# Altium footprint library ST封装.PcbLib: 1336 footprints (part 63 of 109)
Each footprint in its own frame and in the unit in brackets; x right, y up, seen from the top. Pads: shape width x height; smd on the part's side, far side on the other; paste and mask are expansions set on the pad; w line width, h text height; cw(c..) or ccw(c..) is an arc to the next point about the centre after c.
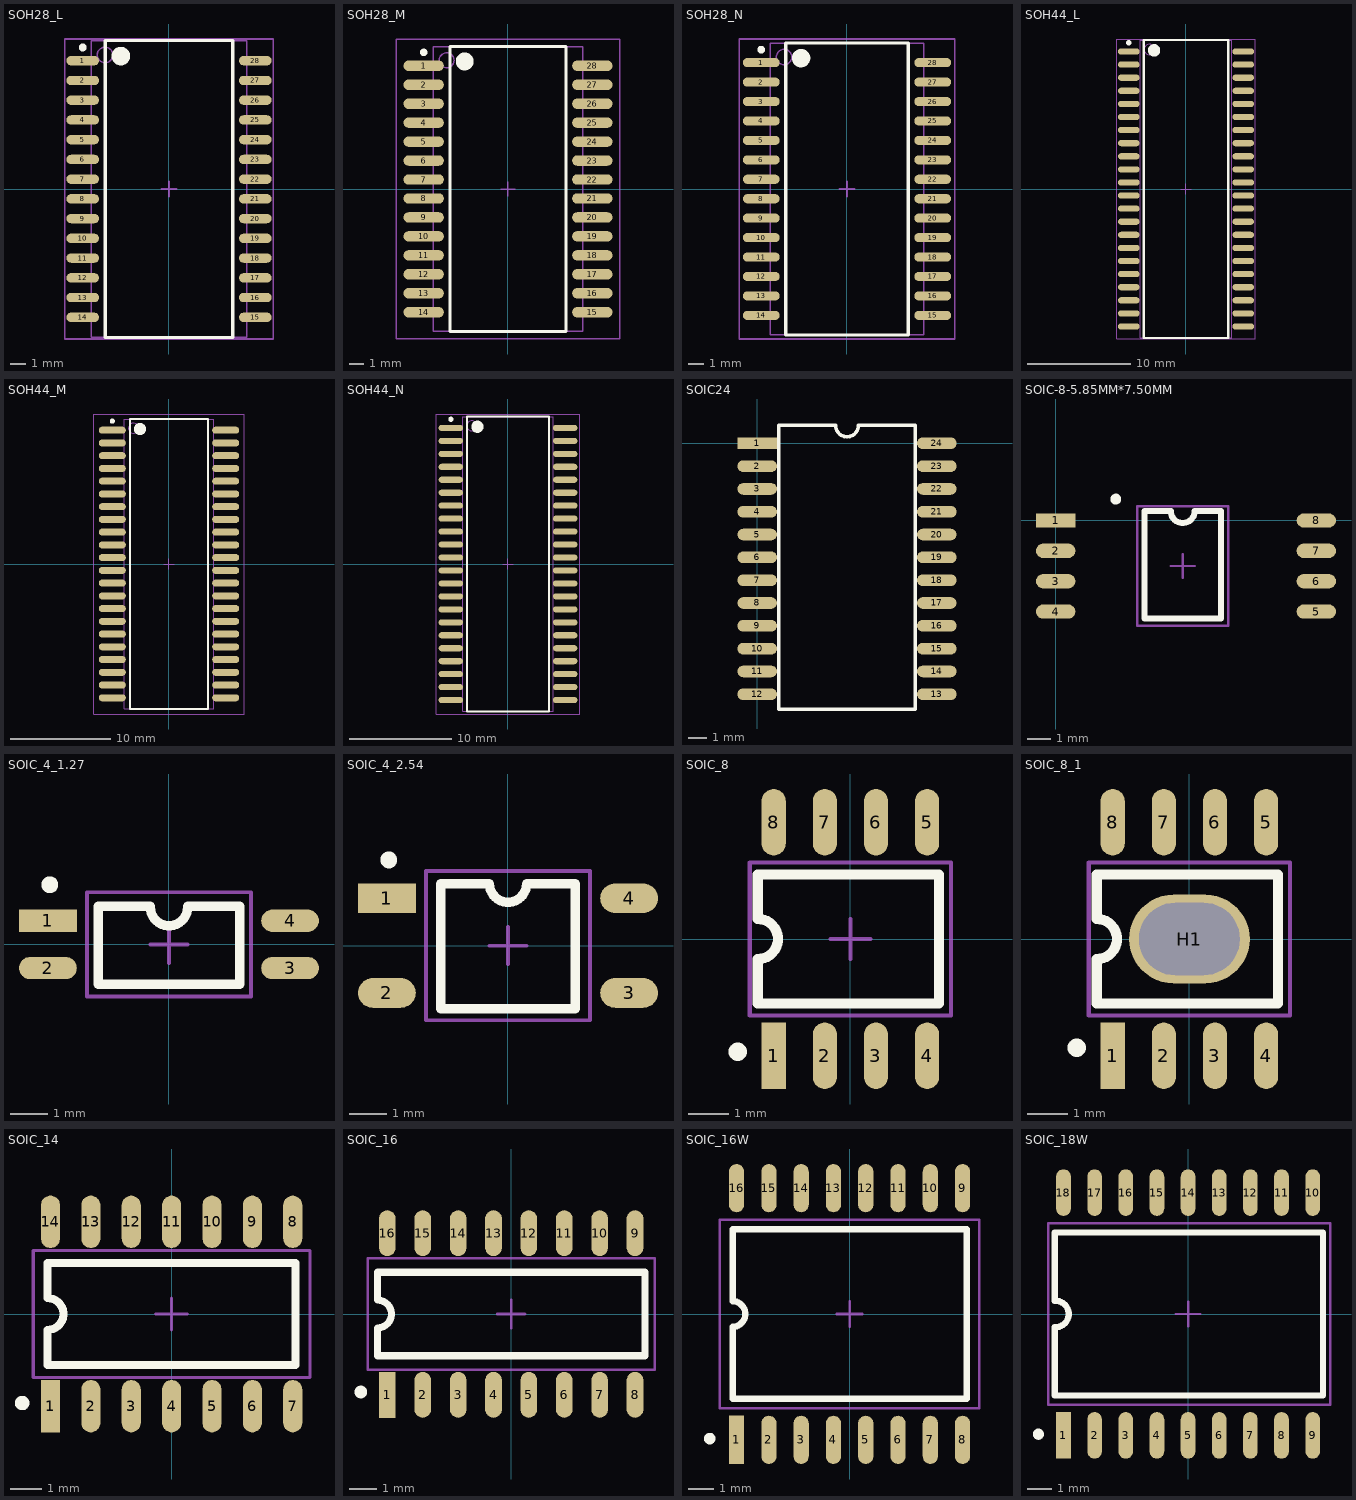
[diagram p62: the footprints below, top view; thin cyan lines are the x and y axes]

## SOH28_L [mm] "28-Pin Plastic Battery Snaphat Small Outline Package 1.27 mm Pitch, IPC High Density"
height 3.05
pads (28):
  oval 2.1x0.6 smd: 1(-5.55,8.255) 2(-5.55,6.985) 3(-5.55,5.715) 4(-5.55,4.445) 5(-5.55,3.175) 6(-5.55,1.905) 7(-5.55,0.635) 8(-5.55,-0.635) 9(-5.55,-1.905) 10(-5.55,-3.175) 11(-5.55,-4.445) 12(-5.55,-5.715) 13(-5.55,-6.985) 14(-5.55,-8.255) 15(5.55,-8.255) 16(5.55,-6.985) 17(5.55,-5.715) 18(5.55,-4.445) 19(5.55,-3.175) 20(5.55,-1.905) 21(5.55,-0.635) 22(5.55,0.635) 23(5.55,1.905) 24(5.55,3.175) 25(5.55,4.445) 26(5.55,5.715) 27(5.55,6.985) 28(5.55,8.255)
Top Overlay:
  circle w0.6: c-3.1,8.55 r0.3
  circle w0.25: c-5.55,9.105 r0.125
  lines w0.2: -4.1,-9.55 4.1,-9.55 4.1,9.55 -4.1,9.55 -4.1,-9.55
Mechanical 13:
  circle w0.1: c-4.115,8.625 r0.5
  lines w0.1: -5.015,-9.525 5.015,-9.525 5.015,9.525 -5.015,9.525 -5.015,-9.525
Mechanical 15:
  lines w0.1: -0.5,0 0.5,0 ; 0,-0.5 0,0.5 ; -6.7,-9.65 6.7,-9.65 6.7,9.65 -6.7,9.65 -6.7,-9.65
3D body: height 3.05, standoff 0, extent -5.015,-9.525 5.015,9.525

## SOH28_M [mm] "28-Pin Plastic Battery Snaphat Small Outline Package 1.27 mm Pitch, IPC Low Density"
height 3.05
pads (28):
  oval 2.7x0.7 smd: 1(-5.65,8.255) 2(-5.65,6.985) 3(-5.65,5.715) 4(-5.65,4.445) 5(-5.65,3.175) 6(-5.65,1.905) 7(-5.65,0.635) 8(-5.65,-0.635) 9(-5.65,-1.905) 10(-5.65,-3.175) 11(-5.65,-4.445) 12(-5.65,-5.715) 13(-5.65,-6.985) 14(-5.65,-8.255) 15(5.65,-8.255) 16(5.65,-6.985) 17(5.65,-5.715) 18(5.65,-4.445) 19(5.65,-3.175) 20(5.65,-1.905) 21(5.65,-0.635) 22(5.65,0.635) 23(5.65,1.905) 24(5.65,3.175) 25(5.65,4.445) 26(5.65,5.715) 27(5.65,6.985) 28(5.65,8.255)
Top Overlay:
  circle w0.6: c-2.9,8.55 r0.3
  circle w0.25: c-5.65,9.155 r0.125
  lines w0.2: -3.9,-9.55 3.9,-9.55 3.9,9.55 -3.9,9.55 -3.9,-9.55
Mechanical 13:
  circle w0.1: c-4.115,8.625 r0.5
  lines w0.1: -5.015,-9.525 5.015,-9.525 5.015,9.525 -5.015,9.525 -5.015,-9.525
Mechanical 15:
  lines w0.1: -0.5,0 0.5,0 ; 0,-0.5 0,0.5 ; -7.5,-10.05 7.5,-10.05 7.5,10.05 -7.5,10.05 -7.5,-10.05
3D body: height 3.05, standoff 0, extent -5.015,-9.525 5.015,9.525

## SOH28_N [mm] "28-Pin Plastic Battery Snaphat Small Outline Package 1.27 mm Pitch, IPC Medium Density"
height 3.05
pads (28):
  oval 2.4x0.6 smd: 1(-5.6,8.255) 2(-5.6,6.985) 3(-5.6,5.715) 4(-5.6,4.445) 5(-5.6,3.175) 6(-5.6,1.905) 7(-5.6,0.635) 8(-5.6,-0.635) 9(-5.6,-1.905) 10(-5.6,-3.175) 11(-5.6,-4.445) 12(-5.6,-5.715) 13(-5.6,-6.985) 14(-5.6,-8.255) 15(5.6,-8.255) 16(5.6,-6.985) 17(5.6,-5.715) 18(5.6,-4.445) 19(5.6,-3.175) 20(5.6,-1.905) 21(5.6,-0.635) 22(5.6,0.635) 23(5.6,1.905) 24(5.6,3.175) 25(5.6,4.445) 26(5.6,5.715) 27(5.6,6.985) 28(5.6,8.255)
Top Overlay:
  circle w0.25: c-5.6,9.105 r0.125
  circle w0.6: c-3,8.55 r0.3
  lines w0.2: -4,-9.55 -4,9.55 4,9.55 4,-9.55 -4,-9.55
Mechanical 13:
  circle w0.1: c-4.115,8.625 r0.5
  lines w0.1: -5.015,-9.525 -5.015,9.525 5.015,9.525 5.015,-9.525 -5.015,-9.525
Mechanical 15:
  lines w0.1: -0.5,0 0.5,0 ; 0,-0.5 0,0.5 ; -7.05,-9.8 -7.05,9.8 7.05,9.8 7.05,-9.8 -7.05,-9.8
3D body: height 3.05, standoff 0, extent -5.015,-9.525 5.015,9.525

## SOH44_L [mm] "44-Pin Plastic Battery Snaphat Small Outline Package 1.27 mm Pitch, IPC High Density"
height 3.05
pads (44):
  oval 2.1x0.6 smd: 1(-5.55,13.335) 2(-5.55,12.065) 3(-5.55,10.795) 4(-5.55,9.525) 5(-5.55,8.255) 6(-5.55,6.985) 7(-5.55,5.715) 8(-5.55,4.445) 9(-5.55,3.175) 10(-5.55,1.905) 11(-5.55,0.635) 12(-5.55,-0.635) 13(-5.55,-1.905) 14(-5.55,-3.175) 15(-5.55,-4.445) 16(-5.55,-5.715) 17(-5.55,-6.985) 18(-5.55,-8.255) 19(-5.55,-9.525) 20(-5.55,-10.795) 21(-5.55,-12.065) 22(-5.55,-13.335) 23(5.55,-13.335) 24(5.55,-12.065) 25(5.55,-10.795) 26(5.55,-9.525) 27(5.55,-8.255) 28(5.55,-6.985) 29(5.55,-5.715) 30(5.55,-4.445) 31(5.55,-3.175) 32(5.55,-1.905) 33(5.55,-0.635) 34(5.55,0.635) 35(5.55,1.905) 36(5.55,3.175) 37(5.55,4.445) 38(5.55,5.715) 39(5.55,6.985) 40(5.55,8.255) 41(5.55,9.525) 42(5.55,10.795) 43(5.55,12.065) 44(5.55,13.335)
Top Overlay:
  circle w0.6: c-3.1,13.45 r0.3
  circle w0.25: c-5.55,14.185 r0.125
  lines w0.2: -4.1,-14.45 4.1,-14.45 4.1,14.45 -4.1,14.45 -4.1,-14.45
Mechanical 13:
  circle w0.1: c-3.545,13.535 r0.5
  lines w0.1: -4.445,-14.435 4.445,-14.435 4.445,14.435 -4.445,14.435 -4.445,-14.435
Mechanical 15:
  lines w0.1: -0.5,0 0.5,0 ; 0,-0.5 0,0.5 ; -6.7,-14.55 6.7,-14.55 6.7,14.55 -6.7,14.55 -6.7,-14.55
3D body: height 3.05, standoff 0, extent -4.445,-14.435 4.445,14.435

## SOH44_M [mm] "44-Pin Plastic Battery Snaphat Small Outline Package 1.27 mm Pitch, IPC Low Density"
height 3.05
pads (44):
  oval 2.7x0.7 smd: 1(-5.65,13.335) 2(-5.65,12.065) 3(-5.65,10.795) 4(-5.65,9.525) 5(-5.65,8.255) 6(-5.65,6.985) 7(-5.65,5.715) 8(-5.65,4.445) 9(-5.65,3.175) 10(-5.65,1.905) 11(-5.65,0.635) 12(-5.65,-0.635) 13(-5.65,-1.905) 14(-5.65,-3.175) 15(-5.65,-4.445) 16(-5.65,-5.715) 17(-5.65,-6.985) 18(-5.65,-8.255) 19(-5.65,-9.525) 20(-5.65,-10.795) 21(-5.65,-12.065) 22(-5.65,-13.335) 23(5.65,-13.335) 24(5.65,-12.065) 25(5.65,-10.795) 26(5.65,-9.525) 27(5.65,-8.255) 28(5.65,-6.985) 29(5.65,-5.715) 30(5.65,-4.445) 31(5.65,-3.175) 32(5.65,-1.905) 33(5.65,-0.635) 34(5.65,0.635) 35(5.65,1.905) 36(5.65,3.175) 37(5.65,4.445) 38(5.65,5.715) 39(5.65,6.985) 40(5.65,8.255) 41(5.65,9.525) 42(5.65,10.795) 43(5.65,12.065) 44(5.65,13.335)
Top Overlay:
  circle w0.6: c-2.9,13.45 r0.3
  circle w0.25: c-5.65,14.235 r0.125
  lines w0.2: -3.9,-14.45 3.9,-14.45 3.9,14.45 -3.9,14.45 -3.9,-14.45
Mechanical 13:
  circle w0.1: c-3.545,13.535 r0.5
  lines w0.1: -4.445,-14.435 4.445,-14.435 4.445,14.435 -4.445,14.435 -4.445,-14.435
Mechanical 15:
  lines w0.1: -0.5,0 0.5,0 ; 0,-0.5 0,0.5 ; -7.5,-14.95 7.5,-14.95 7.5,14.95 -7.5,14.95 -7.5,-14.95
3D body: height 3.05, standoff 0, extent -4.445,-14.435 4.445,14.435

## SOH44_N [mm] "44-Pin Plastic Battery Snaphat Small Outline Package 1.27 mm Pitch, IPC Medium Density"
height 3.05
pads (44):
  oval 2.4x0.6 smd: 1(-5.6,13.335) 2(-5.6,12.065) 3(-5.6,10.795) 4(-5.6,9.525) 5(-5.6,8.255) 6(-5.6,6.985) 7(-5.6,5.715) 8(-5.6,4.445) 9(-5.6,3.175) 10(-5.6,1.905) 11(-5.6,0.635) 12(-5.6,-0.635) 13(-5.6,-1.905) 14(-5.6,-3.175) 15(-5.6,-4.445) 16(-5.6,-5.715) 17(-5.6,-6.985) 18(-5.6,-8.255) 19(-5.6,-9.525) 20(-5.6,-10.795) 21(-5.6,-12.065) 22(-5.6,-13.335) 23(5.6,-13.335) 24(5.6,-12.065) 25(5.6,-10.795) 26(5.6,-9.525) 27(5.6,-8.255) 28(5.6,-6.985) 29(5.6,-5.715) 30(5.6,-4.445) 31(5.6,-3.175) 32(5.6,-1.905) 33(5.6,-0.635) 34(5.6,0.635) 35(5.6,1.905) 36(5.6,3.175) 37(5.6,4.445) 38(5.6,5.715) 39(5.6,6.985) 40(5.6,8.255) 41(5.6,9.525) 42(5.6,10.795) 43(5.6,12.065) 44(5.6,13.335)
Top Overlay:
  circle w0.6: c-3,13.45 r0.3
  circle w0.25: c-5.6,14.185 r0.125
  lines w0.2: -4,-14.45 4,-14.45 4,14.45 -4,14.45 -4,-14.45
Mechanical 13:
  circle w0.1: c-3.545,13.535 r0.5
  lines w0.1: -4.445,-14.435 4.445,-14.435 4.445,14.435 -4.445,14.435 -4.445,-14.435
Mechanical 15:
  lines w0.1: -0.5,0 0.5,0 ; 0,-0.5 0,0.5 ; -7.05,-14.7 7.05,-14.7 7.05,14.7 -7.05,14.7 -7.05,-14.7
3D body: height 3.05, standoff 0, extent -4.445,-14.435 4.445,14.435

## SOIC24 [mm]
pads (24):
  rect 2.2x0.65 smd: 1(0,0)
  oval 2.2x0.65 smd: 2(0,-1.27) 3(0,-2.54) 4(0,-3.81) 5(0,-5.08) 6(0,-6.35) 7(0,-7.62) 8(0,-8.89) 9(0,-10.16) 10(0,-11.43) 11(0,-12.7) 12(0,-13.97) 13(10,-13.97) 14(10,-12.7) 15(10,-11.43) 16(10,-10.16) 17(10,-8.89) 18(10,-7.62) 19(10,-6.35) 20(10,-5.08) 21(10,-3.81) 22(10,-2.54) 23(10,-1.27) 24(10,0)
Top Overlay:
  lines w0.2: 1.19,-14.814 1.19,-14.199 1.19,0.381 1.19,0.996 4.365,0.996 ccw(c5,0.996) 5.635,0.996 8.81,0.996 8.81,0.381 8.81,-14.199 8.81,-14.814 1.19,-14.814

## SOIC-8-5.85MM*7.50MM [mm]
pads (8):
  rect 1.65x0.6 smd: 1(0,0)
  oval 1.65x0.6 smd: 2(0,-1.27) 3(0,-2.54) 4(0,-3.81) 5(10.9,-3.81) 6(10.9,-2.54) 7(10.9,-1.27) 8(10.9,0)
Top Overlay:
  circle w0.254: c2.513,0.895 r0.1
  lines w0.254: 3.713,-4.105 6.913,-4.105 6.913,0.395 5.813,0.395 cw(c5.313,0.395) 4.813,0.395 3.713,0.395 3.713,-4.105
Mechanical 15:
  lines w0.1: 4.813,-1.905 5.813,-1.905 ; 5.313,-2.405 5.313,-1.405 ; 3.413,-4.405 7.213,-4.405 7.213,0.595 3.413,0.595 3.413,-4.405
3D body "DWV0008A.stp": height 2.67, standoff -0.03, extent -0.343,-4.9 11.193,0.95

## SOIC_4_1.27 [mm]
pads (4):
  rect 1.55x0.6 smd: 1(-3.25,0.635)
  oval 1.55x0.6 smd: 2(-3.25,-0.635) 3(3.25,-0.635) 4(3.25,0.635)
Top Overlay:
  circle w0.254: c-3.2,1.6 r0.1
  lines w0.254: -0.5,1 ccw(c0,1) 0.5,1 ; -0.5,1.03 -1.9,1.03 -1.9,-1.065 1.9,-1.065 1.9,1.03 0.5,1.03
Mechanical 15:
  lines w0.1: -0.5,0 0.5,0 ; 0,-0.5 0,0.5 ; -2.2,-1.4 -2.2,1.4 2.2,1.4 2.2,-1.4 -2.2,-1.4
3D body "SOIC-4-1.step": height 2.1, standoff 0, extent -3.5,-1.4 3.5,1.4

## SOIC_4_2.54 [mm]
pads (4):
  rect 1.55x0.8 smd: 1(-3.25,1.27)
  oval 1.55x0.8 smd: 2(-3.25,-1.27) 3(3.25,-1.27) 4(3.25,1.27)
Top Overlay:
  circle w0.254: c-3.2,2.3 r0.1
  lines w0.254: -1.8,-1.7 1.8,-1.7 1.8,1.665 0.5,1.665 cw(c0,1.665) -0.5,1.665 -1.8,1.665 -1.8,-1.7
Mechanical 15:
  lines w0.1: -0.5,0 0.5,0 ; 0,-0.5 0,0.5 ; -2.2,-2 2.2,-2 2.2,2 -2.2,2 -2.2,-2
3D body "SOP-4.STEP": height 2.02, standoff -0.02, extent -3.43,-2 3.43,2

## SOIC_8 [mm]
pads (8):
  rect 0.6x1.65 smd: 1(-1.905,-2.9)
  oval 0.6x1.65 smd: 2(-0.635,-2.9) 3(0.635,-2.9) 4(1.905,-2.9) 5(1.905,2.9) 6(0.635,2.9) 7(-0.635,2.9) 8(-1.905,2.9)
Top Overlay:
  circle w0.254: c-2.8,-2.8 r0.1
  lines w0.254: -2.3,-1.6 -2.3,-0.5 ccw(c-2.3,0) -2.3,0.5 -2.3,1.6 2.2,1.6 2.2,-1.6 -2.3,-1.6
Mechanical 15:
  lines w0.1: -0.5,0 0.5,0 ; 0,-0.5 0,0.5 ; -2.5,-1.9 -2.5,1.9 2.5,1.9 2.5,-1.9 -2.5,-1.9
3D body "SOIC8.STEP": height 1.75, standoff 0, extent -2.5,-3.006 2.5,3.006

## SOIC_8_1 [mm]
pads (9):
  rect 0.6x1.65 smd: 1(-1.905,-2.9)
  oval 0.6x1.65 smd: 2(-0.635,-2.9) 3(0.635,-2.9) 4(1.905,-2.9) 5(1.905,2.9) 6(0.635,2.9) 7(-0.635,2.9) 8(-1.905,2.9)
  oval 3x2.2 hole 1.8 slot 2.5 at 0 deg: H1(0,0)
Top Overlay:
  circle w0.254: c-2.8,-2.7 r0.1
  lines w0.254: -2.3,-1.6 -2.3,-0.5 ccw(c-2.3,0) -2.3,0.5 -2.3,1.6 2.2,1.6 2.2,-1.6 -2.3,-1.6
Mechanical 15:
  lines w0.1: -2.5,-1.9 2.5,-1.9 2.5,1.9 -2.5,1.9 -2.5,-1.9
3D body "SOIC8.STEP": height 1.75, standoff 0, extent -2.5,-3.006 2.5,3.006

## SOIC_14 [mm]
pads (14):
  rect 0.6x1.65 smd: 1(-3.81,-2.9)
  oval 0.6x1.65 smd: 2(-2.54,-2.9) 3(-1.27,-2.9) 4(0,-2.9) 5(1.27,-2.9) 6(2.54,-2.9) 7(3.81,-2.9) 8(3.81,2.9) 9(2.54,2.9) 10(1.27,2.9) 11(0,2.9) 12(-1.27,2.9) 13(-2.54,2.9) 14(-3.81,2.9)
Top Overlay:
  circle w0.254: c-4.7,-2.8 r0.1
  lines w0.254: -3.9,-1.6 -3.9,-0.5 ccw(c-3.9,0) -3.9,0.5 -3.9,1.6 3.9,1.6 3.9,-1.6 -3.9,-1.6
Mechanical 15:
  lines w0.1: -0.5,0 0.5,0 ; 0,-0.5 0,0.5 ; -4.35,-2 -4.35,2 4.35,2 4.35,-2 -4.35,-2
3D body "SOIC14.STEP": height 1.95, standoff 0, extent -4.35,-3.03 4.35,3.026

## SOIC_16 [mm]
pads (16):
  rect 0.6x1.65 smd: 1(-4.445,-2.9)
  oval 0.6x1.65 smd: 2(-3.175,-2.9) 3(-1.905,-2.9) 4(-0.635,-2.9) 5(0.635,-2.9) 6(1.905,-2.9) 7(3.175,-2.9) 8(4.445,-2.9) 9(4.445,2.9) 10(3.175,2.9) 11(1.905,2.9) 12(0.635,2.9) 13(-0.635,2.9) 14(-1.905,2.9) 15(-3.175,2.9) 16(-4.445,2.9)
Top Overlay:
  circle w0.254: c-5.4,-2.8 r0.1
  lines w0.254: -4.8,-1.5 -4.8,-0.5 ccw(c-4.8,0) -4.8,0.5 -4.8,1.5 4.8,1.5 4.8,-1.5 -4.8,-1.5
Mechanical 15:
  lines w0.1: -0.5,0 0.5,0 ; 0,-0.5 0,0.5 ; -5.15,-2 5.15,-2 5.15,2 -5.15,2 -5.15,-2
3D body "SOIC16.STEP": height 1.95, standoff 0, extent -5.15,-3.03 5.15,3.026

## SOIC_16W [mm] "7.4"
pads (16):
  rect 0.6x1.9 smd: 1(-4.445,-4.95)
  oval 0.6x1.9 smd: 2(-3.175,-4.95) 3(-1.905,-4.95) 4(-0.635,-4.95) 5(0.635,-4.95) 6(1.905,-4.95) 7(3.175,-4.95) 8(4.445,-4.95) 9(4.445,4.95) 10(3.175,4.95) 11(1.905,4.95) 12(0.635,4.95) 13(-0.635,4.95) 14(-1.905,4.95) 15(-3.175,4.95) 16(-4.445,4.95)
Top Overlay:
  circle w0.254: c-5.5,-4.9 r0.1
  lines w0.254: -4.6,-3.325 4.6,-3.325 4.6,3.325 -4.6,3.325 -4.6,0.5 cw(c-4.6,0) -4.6,-0.5 -4.6,-3.325
Mechanical 15:
  lines w0.1: -0.5,0 0.5,0 ; 0,-0.5 0,0.5 ; -5.1,-3.7 -5.1,3.7 5.1,3.7 5.1,-3.7 -5.1,-3.7
3D body "SOIC16L.step": height 3.5, standoff 0, extent -5.1,-5.15 5.1,5.15

## SOIC_18W [mm] "7.4"
pads (18):
  rect 0.6x1.9 smd: 1(-5.08,-4.95)
  oval 0.6x1.9 smd: 2(-3.81,-4.95) 3(-2.54,-4.95) 4(-1.27,-4.95) 5(0,-4.95) 6(1.27,-4.95) 7(2.54,-4.95) 8(3.81,-4.95) 9(5.08,-4.95) 10(5.08,4.95) 11(3.81,4.95) 12(2.54,4.95) 13(1.27,4.95) 14(0,4.95) 15(-1.27,4.95) 16(-2.54,4.95) 17(-3.81,4.95) 18(-5.08,4.95)
Top Overlay:
  circle w0.254: c-6.1,-4.9 r0.1
  lines w0.254: -5.435,-3.325 5.5,-3.325 5.5,3.325 -5.435,3.325 -5.435,0.535 cw(c-5.4,0) -5.435,-0.535 -5.435,-3.325
Mechanical 15:
  lines w0.1: -0.5,0 0.5,0 ; 0,-0.5 0,0.5 ; -5.7,-3.7 -5.7,3.7 5.8,3.7 5.8,-3.7 -5.7,-3.7
3D body "SOIC18L.step": height 2.65, standoff 0, extent -5.73,-5.15 5.8,5.15